# Altium footprint library THU.PcbLib: 477 footprints (part 30 of 30)
Each footprint in its own frame and in the unit in brackets; x right, y up, seen from the top. Pads: shape width x height; smd on the part's side, far side on the other; paste and mask are expansions set on the pad; w line width, h text height; cw(c..) or ccw(c..) is an arc to the next point about the centre after c.
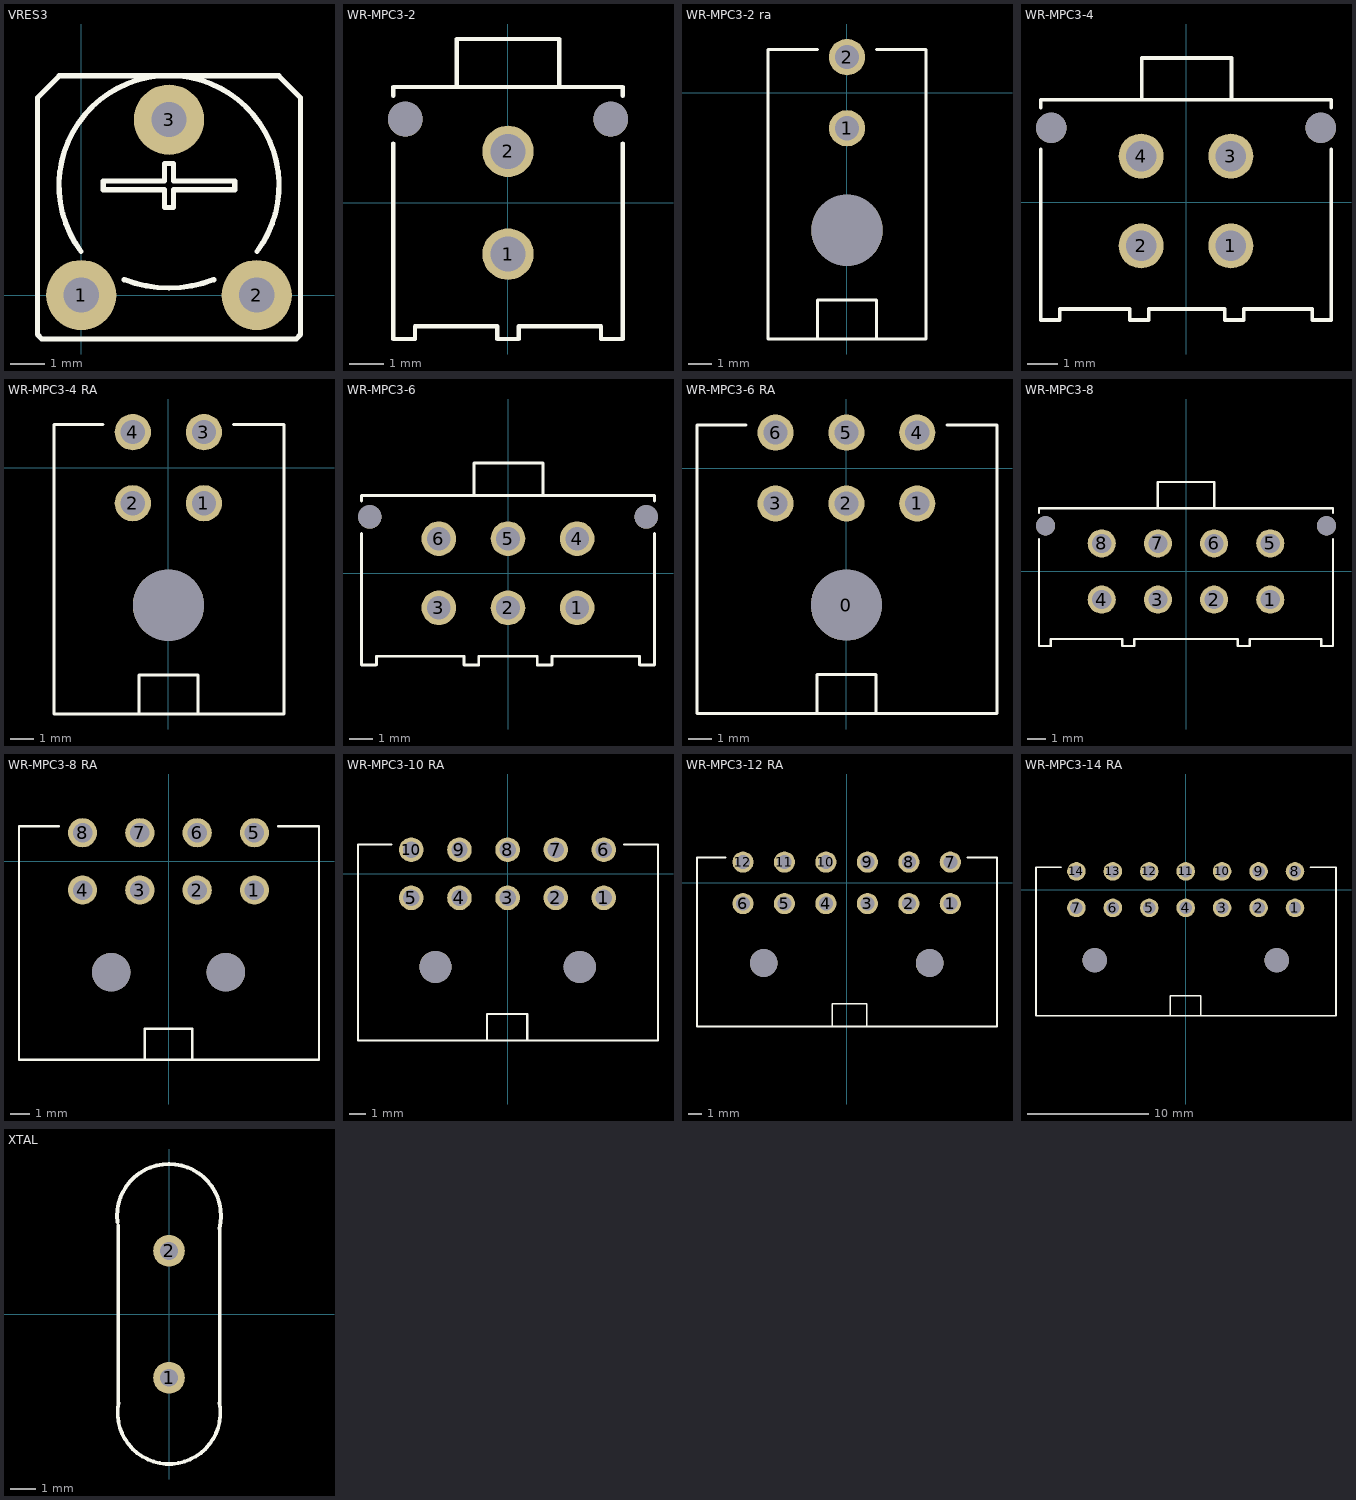
[diagram p29: the footprints below, top view; thin cyan lines are the x and y axes]

## VRES3 [mil] "VARIABLE RESISTOR"
pads (3):
  round 80 hole 40: 1(0,0) 2(200,0) 3(100,200)
TopOverlay:
  lines w6: -0.32,49.76 cw(c100,125) 200.32,49.76 ; 49.1,17.65 ccw(c100,150.08) 150.9,17.65 ; -50,-45 -50,225 -25,250 100,250 225,250 250,225 250,-45 245,-50 -45,-50 -50,-45 ; 25,120 95,120 95,100 105,100 105,120 175,120 175,130 105,130 105,150 95,150 95,130 25,130 25,120

## WR-MPC3-2 [mm]
height 9.9
pads (4):
  round 1.5 hole 1.02: 1(0,-1.5) 2(0,1.5)
  round 1.02 hole 1.02 unplated: ""(-3,2.44) ""(3,2.44)
TopOverlay:
  lines w0.127: -3.35,1.729 -3.35,-3.98 -2.721,-3.98 -2.715,-3.974 -2.715,-3.605 -0.313,-3.605 ; -3.35,3.126 -3.35,3.38 3.35,3.38 3.35,3.126 ; -1.5,3.38 -1.5,4.78 1.5,4.78 1.5,3.38 ; -0.313,-3.605 -0.313,-3.98 0.316,-3.98 0.316,-3.605 2.715,-3.605 2.715,-3.974 2.721,-3.98 ; 3.35,1.729 3.35,-3.98 ; 2.721,-3.98 3.35,-3.98 ; 2.721,-3.98 3.35,-3.98
3D body: height 2, standoff 0, extent -1.676,-3.093 1.651,3.119
3D body: height 9.9, standoff 7, extent -1.524,3.391 1.524,4.788
3D body: height 9.9, standoff 2, extent -1.651,-0.127 1.651,0.127
3D body: height 9.9, standoff 0, extent -3.35,-3.98 3.35,3.38
3D body: height 8, standoff 2, extent -0.317,-1.817 0.318,-1.182
3D body: height 8, standoff 2, extent -0.317,1.183 0.318,1.818

## WR-MPC3-2 ra [mm]
height 8.76
pads (3):
  round 1.53 hole 1.02: 1(0,-1.5) 2(0,1.5)
  round 3 hole 3 unplated: ""(0,-5.8)
TopOverlay:
  lines w0.127: -1.25,-10.363 -1.25,-8.75 1.25,-8.75 1.25,-10.363 ; -1.25,1.829 -3.326,1.829 -3.326,-10.389 3.326,-10.389 3.326,1.829 1.25,1.829
3D body "STEP-66200221022-rev1.stp": height 8.79, standoff -3.17, extent -3.327,-10.417 3.373,1.803

## WR-MPC3-4 [mm]
height 9.9
pads (6):
  round 1.5 hole 1.02: 1(1.5,-1.462) 2(-1.5,-1.462) 3(1.5,1.538) 4(-1.5,1.538)
  round 1.02 hole 1.02 unplated: ""(-4.5,2.478) ""(4.5,2.478)
TopOverlay:
  lines w0.127: -4.85,1.767 -4.85,-3.942 -4.221,-3.942 -4.215,-3.936 -4.215,-3.567 -1.881,-3.567 -1.881,-3.942 -1.246,-3.942 -1.246,-3.567 1.294,-3.567 1.294,-3.942 1.929,-3.942 1.929,-3.567 4.215,-3.567 4.215,-3.936 4.221,-3.942 4.85,-3.942 4.85,1.767 ; -4.85,3.164 -4.85,3.418 4.85,3.418 4.85,3.164 ; -1.476,3.418 -1.476,4.818 1.524,4.818 1.524,3.418
3D body: height 8, standoff 2, extent -1.817,1.221 -1.182,1.856
3D body: height 8, standoff 2, extent 1.183,1.221 1.818,1.856
3D body: height 8, standoff 2, extent 1.183,-1.779 1.818,-1.144
3D body: height 8, standoff 2, extent -1.817,-1.779 -1.182,-1.144
3D body: height 2, standoff 0, extent -3.151,-3.048 3.35,3.164
3D body: height 9.9, standoff 0, extent -4.85,-3.942 4.85,3.418
3D body: height 9.9, standoff 2, extent -0.127,-3.048 0.127,0.508
3D body: height 9.9, standoff 2, extent -0.127,0.508 0.127,3.429
3D body: height 9.9, standoff 2, extent -3.151,-0.089 -0.47,0.165
3D body: height 9.9, standoff 2, extent -0.47,-0.089 3.35,0.165
3D body: height 9.9, standoff 7, extent -1.5,3.429 1.548,4.826

## WR-MPC3-4 RA [mm]
height 8.76
pads (5):
  round 1.53 hole 1.02: 1(1.5,-1.5) 2(-1.5,-1.5) 3(1.5,1.5) 4(-1.5,1.5)
  round 3 hole 3 unplated: ""(0,-5.8)
TopOverlay:
  lines w0.127: -2.75,1.829 -4.826,1.829 -4.826,-10.389 4.877,-10.389 4.877,1.829 2.75,1.829 ; -1.25,-10.389 -1.25,-8.75 1.25,-8.75 1.25,-10.338
3D body "STEP-66200421022-rev1.stp": height 8.79, standoff -3.17, extent -4.823,-10.391 4.877,1.829

## WR-MPC3-6 [mm]
height 9.9
pads (8):
  round 1.5 hole 1.02: 1(3,-1.5) 2(0,-1.5) 3(-3,-1.5) 4(3,1.5) 5(0,1.5) 6(-3,1.5)
  round 1.02 hole 1.02 unplated: ""(-6,2.44) ""(6,2.44)
TopOverlay:
  lines w0.127: -6.35,1.729 -6.35,-3.98 -5.721,-3.98 -5.715,-3.974 -5.715,-3.605 -1.905,-3.605 -1.905,-3.98 -1.27,-3.98 -1.27,-3.605 1.27,-3.605 1.27,-3.98 1.905,-3.98 1.905,-3.605 5.715,-3.605 5.715,-3.974 5.721,-3.98 6.35,-3.98 6.35,1.729 ; -6.35,3.126 -6.35,3.38 ; -6.326,3.38 6.35,3.38 6.35,3.126 ; -1.476,3.38 -1.476,4.78 1.524,4.78 1.524,3.38
3D body: height 8, standoff 2, extent -3.317,1.183 -2.682,1.818
3D body: height 8, standoff 2, extent -0.317,1.183 0.318,1.818
3D body: height 8, standoff 2, extent 2.683,1.183 3.318,1.818
3D body: height 8, standoff 2, extent 2.683,-1.817 3.318,-1.182
3D body: height 8, standoff 2, extent -0.317,-1.817 0.318,-1.182
3D body: height 8, standoff 2, extent -3.317,-1.817 -2.682,-1.182
3D body: height 2, standoff 0, extent -4.929,-3.086 4.85,3.126
3D body: height 9.9, standoff 0, extent -6.35,-3.98 6.35,3.38
3D body: height 9.9, standoff 2, extent -1.627,0.47 -1.373,3.391
3D body: height 9.9, standoff 2, extent -1.627,-3.086 -1.373,0.47
3D body: height 9.9, standoff 2, extent 1.373,-3.086 1.627,0.47
3D body: height 9.9, standoff 2, extent 1.373,0.47 1.627,3.391
3D body: height 9.9, standoff 2, extent -4.97,-0.127 -1.5,0.127
3D body: height 9.9, standoff 2, extent -1.85,-0.127 1.03,0.127
3D body: height 9.9, standoff 2, extent 1.03,-0.127 4.85,0.127
3D body: height 9.9, standoff 7, extent -1.5,3.391 1.548,4.788

## WR-MPC3-6 RA [mm]
height 8.76
pads (7):
  round 3 hole 3 unplated: 0(0,-5.8)
  round 1.53 hole 1.02: 1(3,-1.5) 2(0,-1.5) 3(-3,-1.5) 4(3,1.5) 5(0,1.5) 6(-3,1.5)
TopOverlay:
  lines w0.127: -4.25,1.829 -6.326,1.829 -6.326,-10.389 6.377,-10.389 6.377,1.829 4.25,1.829 ; -1.25,-10.389 -1.25,-8.75 1.25,-8.75 1.25,-10.338
3D body "STEP-66200621022-rev1.stp": height 1.63, standoff -10.33, extent -6.325,-10.391 6.375,1.829

## WR-MPC3-8 [mm] "3.00 MM MALE DUAL ROW VERTICAL HEADER"
height 0.251
pads (10):
  round 1.5 hole 1.02: 1(4.5,-1.5) 2(1.5,-1.5) 3(-1.5,-1.5) 4(-4.5,-1.5) 5(4.5,1.5) 6(1.5,1.5) 7(-1.5,1.5) 8(-4.5,1.5)
  round 1.02 hole 1.02 unplated: ""(-7.5,2.44) ""(7.5,2.44)
TopOverlay:
  lines w0.127: -7.85,1.729 -7.85,-3.98 -7.221,-3.98 -7.215,-3.974 -7.215,-3.605 -3.405,-3.605 -3.405,-3.98 -2.77,-3.98 -2.77,-3.605 2.77,-3.605 2.77,-3.98 3.405,-3.98 3.405,-3.605 7.215,-3.605 7.215,-3.974 7.221,-3.98 7.85,-3.98 7.85,1.729 ; -7.85,3.126 -7.85,3.38 7.85,3.38 7.85,3.126 ; -1.5,3.38 -1.5,4.78 1.5,4.78 1.5,3.38
3D body: height 9.9, standoff 7, extent -1.524,3.391 1.524,4.788
3D body: height 9.9, standoff 2, extent 2.53,-0.127 6.35,0.127
3D body: height 9.9, standoff 2, extent -0.35,-0.127 2.53,0.127
3D body: height 9.9, standoff 2, extent -6.35,-0.127 -3.47,0.127
3D body: height 9.9, standoff 2, extent -3.47,-0.127 0,0.127
3D body: height 9.9, standoff 2, extent -3.127,0.47 -2.873,3.391
3D body: height 9.9, standoff 2, extent -3.127,-3.086 -2.873,0.47
3D body: height 9.9, standoff 2, extent 2.873,0.47 3.127,3.391
3D body: height 9.9, standoff 2, extent 2.873,-3.086 3.127,0.47
3D body: height 9.9, standoff 2, extent -0.127,-3.086 0.127,0.47
3D body: height 9.9, standoff 2, extent -0.127,0.47 0.127,3.391
3D body: height 9.9, standoff 0, extent -7.85,-3.986 7.85,3.38
3D body: height 2, standoff 0, extent -6.35,-3.086 6.35,3.126
3D body: height 8, standoff 2, extent -4.817,-1.817 -4.182,-1.182
3D body: height 8, standoff 2, extent -1.817,-1.817 -1.182,-1.182
3D body: height 8, standoff 2, extent 1.183,-1.817 1.818,-1.182
3D body: height 8, standoff 2, extent 4.183,-1.817 4.818,-1.182
3D body: height 8, standoff 2, extent 4.183,1.183 4.818,1.818
3D body: height 8, standoff 2, extent 1.183,1.183 1.818,1.818
3D body: height 8, standoff 2, extent -1.817,1.183 -1.182,1.818
3D body: height 8, standoff 2, extent -4.817,1.183 -4.182,1.818

## WR-MPC3-8 RA [mm]
height 8.76
pads (10):
  round 1.53 hole 1.02: 1(4.5,-1.5) 2(1.5,-1.5) 3(-1.5,-1.5) 4(-4.5,-1.5) 5(4.5,1.5) 6(1.5,1.5) 7(-1.5,1.5) 8(-4.5,1.5)
  round 2 hole 2 unplated: ""(-3,-5.8) ""(3,-5.8)
TopOverlay:
  lines w0.127: -5.75,1.829 -7.826,1.829 -7.826,-10.389 7.877,-10.389 7.877,1.829 5.75,1.829 ; -1.25,-10.389 -1.25,-8.75 1.25,-8.75 1.25,-10.338
3D body "STEP-66200821022-rev1.stp": height 8.79, standoff -3.17, extent -7.85,-10.391 7.85,1.829

## WR-MPC3-10 RA [mm]
height 8.76
pads (12):
  round 1.53 hole 1.02: 1(6,-1.5) 2(3,-1.5) 3(0,-1.5) 4(-3,-1.5) 5(-6,-1.5) 6(6,1.5) 7(3,1.5) 8(0,1.5) 9(-3,1.5) 10(-6,1.5)
  round 2 hole 2 unplated: ""(-4.5,-5.8) ""(4.5,-5.8)
TopOverlay:
  lines w0.127: -7.25,1.829 -9.326,1.829 -9.326,-10.389 9.377,-10.389 9.377,1.829 7.25,1.829 ; -1.274,-10.389 -1.274,-8.75 1.226,-8.75 1.226,-10.338
3D body "STEP-66201021022-rev1.stp": height 8.78, standoff -3.18, extent -9.35,-10.391 9.35,1.829

## WR-MPC3-12 RA [mm]
height 8.76
pads (14):
  round 1.53 hole 1.02: 1(7.5,-1.5) 2(4.5,-1.5) 3(1.5,-1.5) 4(-1.5,-1.5) 5(-4.5,-1.5) 6(-7.5,-1.5) 7(7.5,1.5) 8(4.5,1.5) 9(1.5,1.5) 10(-1.5,1.5) 11(-4.5,1.5) 12(-7.5,1.5)
  round 2 hole 2 unplated: ""(-6,-5.8) ""(6,-5.8)
TopOverlay:
  lines w0.127: -8.75,1.829 -10.826,1.829 -10.826,-10.389 10.877,-10.389 10.877,1.829 8.75,1.829 ; -1.049,-10.389 -1.049,-8.75 1.451,-8.75 1.451,-10.338
3D body "STEP-66201221022 (rev1).stp": height 8.78, standoff -3.18, extent -10.823,-10.389 10.877,1.831

## WR-MPC3-14 RA [mm]
height 8.76
pads (16):
  round 1.53 hole 1.02: 1(9,-1.5) 2(6,-1.5) 3(3,-1.5) 4(0,-1.5) 5(-3,-1.5) 6(-6,-1.5) 7(-9,-1.5) 8(9,1.5) 9(6,1.5) 10(3,1.5) 11(0,1.5) 12(-3,1.5) 13(-6,1.5) 14(-9,1.5)
  round 2 hole 2 unplated: ""(-7.5,-5.8) ""(7.5,-5.8)
TopOverlay:
  lines w0.127: -10.25,1.829 -12.326,1.829 -12.326,-10.389 12.377,-10.389 12.377,1.829 10.25,1.829 ; -1.274,-10.389 -1.274,-8.75 1.226,-8.75 1.226,-10.338
3D body "STEP-66201421022 (rev1).stp": height 8.78, standoff -3.18, extent -12.323,-10.389 12.377,1.831

## XTAL [mil]
pads (2):
  round 50 hole 28: 1(0,-100) 2(0,100)
TopOverlay:
  lines w6: -81.39,145.01 cw(c0,155) 79.56,135.16 ; -80,-140 -80,140 ; -79.51,-139.54 ccw(c0,-155) 79.51,-139.54 ; 80,-140 80,135